# Altium footprint library LED.PcbLib: 71 footprints (part 2 of 5)
Each footprint in its own frame and in the unit in brackets; x right, y up, seen from the top. Pads: shape width x height; smd on the part's side, far side on the other; paste and mask are expansions set on the pad; w line width, h text height; cw(c..) or ccw(c..) is an arc to the next point about the centre after c.
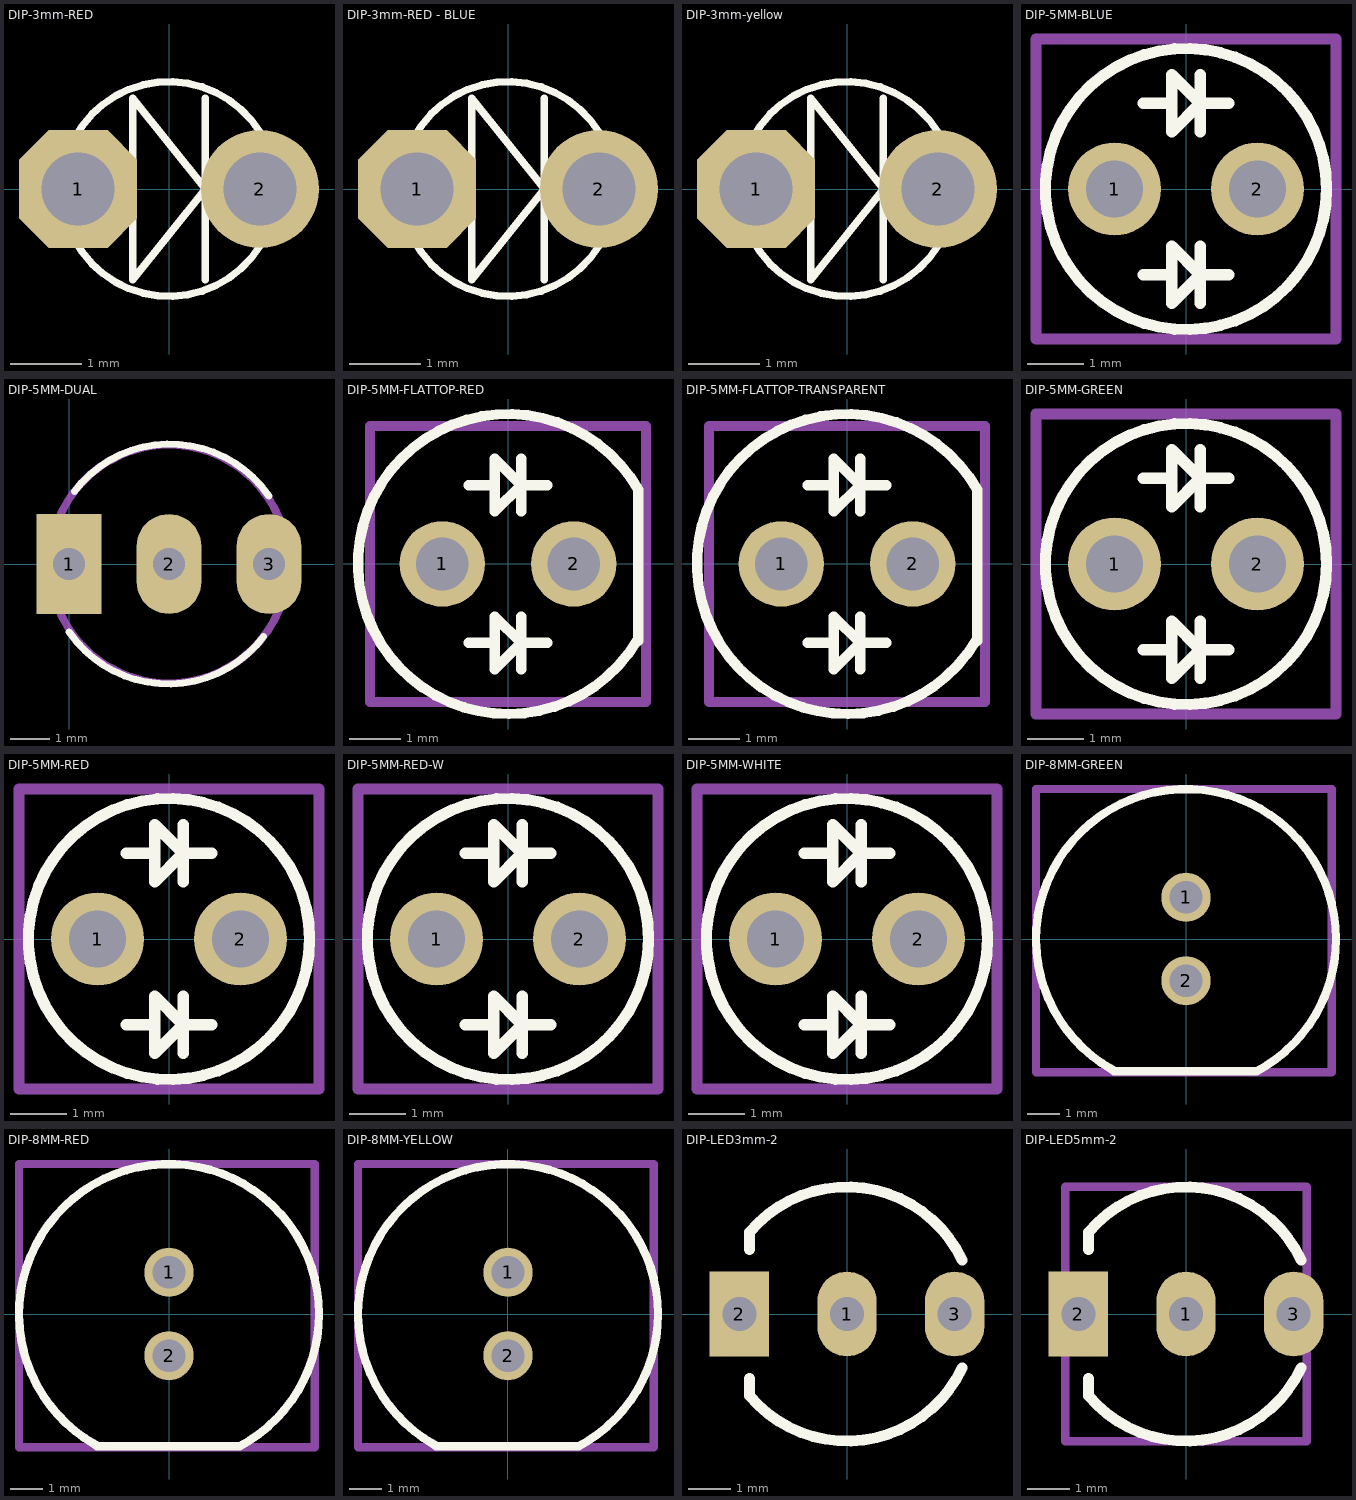
[diagram p1: the footprints below, top view; thin cyan lines are the x and y axes]

## DIP-3mm-RED [mil]
pads (2):
  oct 65x65 hole 40: 1(-50,0)
  round 65 hole 40: 2(50,0)
Top Overlay:
  circle w4: c0,0 r59.06
  lines w4: 20,-50 20,0 ; 20,50 20,0 ; 20,0 -20,-50 -20,50 20,0
3D body "User Library-LED-D3R.step": height 181.1, standoff -255.91, extent -77.18,-77.48 67.18,80

## DIP-3mm-RED - BLUE [mil]
pads (2):
  oct 65x65 hole 40: 1(-50,0)
  round 65 hole 40: 2(50,0)
Top Overlay:
  circle w4: c0,0 r59.06
  lines w4: 20,-50 20,0 ; 20,50 20,0 ; 20,0 -20,-50 -20,50 20,0
3D body "User Library-LED-D3R.step": height 181.1, standoff -255.91, extent -77.18,-77.48 67.18,80

## DIP-3mm-yellow [mil]
pads (2):
  oct 65x65 hole 40: 1(-50,0)
  round 65 hole 40: 2(50,0)
Top Overlay:
  circle w4: c0,0 r59.06
  lines w4: 20,-50 20,0 ; 20,50 20,0 ; 20,0 -20,50 -20,-50 20,0
3D body "User Library-LED-D3R.step": height 181.1, standoff -255.91, extent -77.18,-77.48 67.18,80

## DIP-5MM-BLUE [mil]
pads (2):
  round 65 hole 40: 1(-50,0) 2(50,0)
Top Overlay:
  circle w7.87: c0,0 r98.43
  lines w7.87: -30,-60 -10,-60 ; -30,60 -10,60 ; 10,-80 10,-40 ; 10,40 10,80 ; 30,-60 10,-60 ; 30,60 10,60 ; 10,-60 -10,-40 -10,-80 10,-60 ; 10,60 -10,80 -10,40 10,60
Mechanical 13:
  lines w7.87: -105,-105 -105,105 105,105 105,-105 -105,-105
Mechanical 15:
  lines w7.87: -105,-105 -105,105 105,105 105,-105 -105,-105
3D body: height 60, standoff -120, extent -62.5,-13 -37.5,12
3D body: height 110, standoff 70, extent -105,-105.2 105,104.79
3D body: height 370, standoff 170, extent -99.59,-100.31 99.96,99.47
3D body: height 270, standoff 70, extent -99.79,-100.07 100.21,99.68
3D body: height 170, standoff 160, extent -5,-5 5,5
3D body: height 160, standoff 150, extent -29,-7 -20,7
3D body: height 160, standoff 150, extent -15,-33 40,33
3D body: height 150, standoff 50, extent 19,-12.5 62,12.5
3D body: height 150, standoff 50, extent -63,-13 -20,12
3D body: height 50, standoff -120, extent 37,-12.5 62,12.5

## DIP-5MM-DUAL [mil] "LED 3 PIN, 5 ly , Two colour"
height 300
pads (3):
  rect 65x100 hole 32: 1(0,0)
  oval 65x100 hole 32: 2(100,0) 3(200,0)
Top Overlay:
  lines w7: 0.07,-67.92 ccw(c99,0) 194.73,-72.36 ; 5.27,72.36 cw(c101,0) 199.93,67.92
Mechanical 13:
  circle w7.87: c100,0 r119.25
  text ".Designator" at 0,0 h59.06
Mechanical 15:
  circle w7.87: c100,0 r119.25
  text ".Comment" at 0,0 h59.06
3D body "User Library-5mmBiColorLED.step": height 426.6, standoff -102.4, extent -16,-115.98 210,115.98

## DIP-5MM-FLATTOP-RED [mil]
pads (2):
  round 65 hole 40: 1(-50,0) 2(50,0)
Top Overlay:
  lines w7.87: -30,-60 -10,-60 ; -30,60 -10,60 ; 10,-80 10,-40 ; 10,40 10,80 ; 30,-60 10,-60 ; 30,60 10,60 ; 10,-60 -10,-80 -10,-40 10,-60 ; 10,60 -10,40 -10,80 10,60 ; 97.96,-58.65 cw(c0,0) 99.13,56.64 99.13,-58.65 97.96,-58.65
Mechanical 13:
  lines w7.87: -105,-105 105,-105 105,105 -105,105 -105,-105
  text ".Designator" at -62.2,-30.12 h59.06
3D body: height 50, standoff -120, extent 37,-12.5 62,12.5
3D body: height 150, standoff 50, extent -63,-13 -20,12
3D body: height 150, standoff 50, extent 19,-12.5 62,12.5
3D body: height 160, standoff 150, extent -15,-33 40,33
3D body: height 60, standoff -120, extent -62.5,-13 -37.5,12
3D body: height 160, standoff 150, extent -29,-7 -20,7
3D body: height 170, standoff 160, extent -5,-5 5,5
3D body: height 267.72, standoff 0, extent -99.79,-100.07 100.21,99.68
3D body: height 40, standoff 0, extent -113.96,-114.24 114.39,113.85

## DIP-5MM-FLATTOP-TRANSPARENT [mil]
pads (2):
  round 65 hole 40: 1(-50,0) 2(50,0)
Top Overlay:
  lines w7.87: -30,-60 -10,-60 ; -30,60 -10,60 ; 10,-80 10,-40 ; 10,40 10,80 ; 30,-60 10,-60 ; 30,60 10,60 ; 10,-60 -10,-80 -10,-40 10,-60 ; 10,60 -10,40 -10,80 10,60 ; 97.96,-58.65 cw(c0,0) 99.13,56.64 99.13,-58.65 97.96,-58.65
Mechanical 13:
  lines w7.87: -105,-105 105,-105 105,105 -105,105 -105,-105
  text ".Designator" at -62.2,-30.12 h59.06
3D body: height 50, standoff -120, extent 37,-12.5 62,12.5
3D body: height 150, standoff 50, extent -63,-13 -20,12
3D body: height 150, standoff 50, extent 19,-12.5 62,12.5
3D body: height 160, standoff 150, extent -15,-33 40,33
3D body: height 60, standoff -120, extent -62.5,-13 -37.5,12
3D body: height 160, standoff 150, extent -29,-7 -20,7
3D body: height 170, standoff 160, extent -5,-5 5,5
3D body: height 267.72, standoff 0, extent -99.79,-100.07 100.21,99.68
3D body: height 40, standoff 0, extent -113.96,-114.24 114.39,113.85

## DIP-5MM-GREEN [mil]
pads (2):
  round 65 hole 40: 1(-50,0) 2(50,0)
Top Overlay:
  circle w7.87: c0,0 r98.43
  lines w7.87: -30,-60 -10,-60 ; -30,60 -10,60 ; 10,-80 10,-40 ; 10,40 10,80 ; 30,-60 10,-60 ; 30,60 10,60 ; 10,-60 -10,-80 -10,-40 10,-60 ; 10,60 -10,40 -10,80 10,60
Mechanical 13:
  lines w7.87: -105,-105 105,-105 105,105 -105,105 -105,-105
Mechanical 15:
  lines w7.87: -105,-105 105,-105 105,105 -105,105 -105,-105
3D body: height 50, standoff -120, extent 37,-12.5 62,12.5
3D body: height 150, standoff 50, extent -63,-13 -20,12
3D body: height 150, standoff 50, extent 19,-12.5 62,12.5
3D body: height 160, standoff 150, extent -15,-33 40,33
3D body: height 60, standoff -120, extent -62.5,-13 -37.5,12
3D body: height 160, standoff 150, extent -29,-7 -20,7
3D body: height 170, standoff 160, extent -5,-5 5,5
3D body: height 270, standoff 70, extent -99.79,-100.07 100.21,99.68
3D body: height 370, standoff 170, extent -99.59,-100.31 99.96,99.47
3D body: height 110, standoff 70, extent -105,-105.2 105,104.79

## DIP-5MM-RED [mil]
pads (2):
  round 65 hole 40: 1(-50,0) 2(50,0)
Top Overlay:
  circle w7.87: c0,0 r98.43
  lines w7.87: -30,-60 -10,-60 ; -30,60 -10,60 ; 10,-80 10,-40 ; 10,40 10,80 ; 30,-60 10,-60 ; 30,60 10,60 ; 10,-60 -10,-40 -10,-80 10,-60 ; 10,60 -10,80 -10,40 10,60
Mechanical 13:
  lines w7.87: -105,-105 -105,105 105,105 105,-105 -105,-105
Mechanical 15:
  lines w7.87: -105,-105 -105,105 105,105 105,-105 -105,-105
3D body: height 110, standoff 70, extent -104.17,-105 105,104.59
3D body: height 370, standoff 170, extent -99,-100 99.96,99.15
3D body: height 270, standoff 70, extent -99,-100 100.21,99.61
3D body: height 170, standoff 160, extent -5,-5 5,5
3D body: height 160, standoff 150, extent -29,-7 -20,7
3D body: height 60, standoff -120, extent -62.5,-13 -37.5,12
3D body: height 160, standoff 150, extent -15,-33 40,33
3D body: height 150, standoff 50, extent 19,-12.5 62,12.5
3D body: height 150, standoff 50, extent -63,-13 -20,12
3D body: height 50, standoff -120, extent 37,-12.5 62,12.5

## DIP-5MM-RED-W [mil]
pads (2):
  round 65 hole 40: 1(-50,0) 2(50,0)
Top Overlay:
  circle w7.87: c0,0 r98.43
  lines w7.87: -30,-60 -10,-60 ; -30,60 -10,60 ; 10,-80 10,-40 ; 10,40 10,80 ; 30,-60 10,-60 ; 30,60 10,60 ; 10,-60 -10,-40 -10,-80 10,-60 ; 10,60 -10,80 -10,40 10,60
Mechanical 13:
  lines w7.87: -105,-105 -105,105 105,105 105,-105 -105,-105
Mechanical 15:
  lines w7.87: -105,-105 -105,105 105,105 105,-105 -105,-105
3D body "ALSRobot-LED Red 5mm V.STEP": height 314.95, standoff -39.37, extent -119.09,-411.85 103.35,10.27

## DIP-5MM-WHITE [mil]
pads (2):
  round 65 hole 40: 1(-50,0) 2(50,0)
Top Overlay:
  circle w7.87: c0,0 r98.43
  lines w7.87: -30,-60 -10,-60 ; -30,60 -10,60 ; 10,-80 10,-40 ; 10,40 10,80 ; 30,-60 10,-60 ; 30,60 10,60 ; 10,-60 -10,-80 -10,-40 10,-60 ; 10,60 -10,40 -10,80 10,60
Mechanical 13:
  lines w7.87: -105,-105 105,-105 105,105 -105,105 -105,-105
Mechanical 15:
  lines w7.87: -105,-105 105,-105 105,105 -105,105 -105,-105
3D body: height 50, standoff -120, extent 37,-12.5 62,12.5
3D body: height 150, standoff 50, extent -63,-13 -20,12
3D body: height 150, standoff 50, extent 19,-12.5 62,12.5
3D body: height 160, standoff 150, extent -15,-33 40,33
3D body: height 60, standoff -120, extent -62.5,-13 -37.5,12
3D body: height 160, standoff 150, extent -29,-7 -20,7
3D body: height 170, standoff 160, extent -5,-5 5,5
3D body: height 270, standoff 70, extent -99.79,-100.07 100.21,99.68
3D body: height 370, standoff 170, extent -99.59,-100.31 99.96,99.47
3D body: height 110, standoff 70, extent -105,-105.2 105,104.79

## DIP-8MM-GREEN [mm]
pads (2):
  round 1.5 hole 1: 1(0,1.27) 2(0,-1.27)
Top Overlay:
  lines w0.254: -2.241,-3.985 cw(c0,0) 4.572,0 cw(c0,0) 2.152,-4.034 -2.192,-4.034 -2.241,-3.985
Mechanical 13:
  lines w0.254: -4.572,-4.064 -4.572,4.572 4.445,4.572 4.445,-4.064 -4.572,-4.064
  text ".Designator" at -2.54,0 h0.64
Mechanical 15:
  lines w0.254: -4.572,-4.064 -4.572,4.572 4.445,4.572 4.445,-4.064 -4.572,-4.064
  text ".Comment" at -2.54,0 h0.64
3D body "User Library-BL-L813_G.step": height 11, standoff -31, extent -4.5,-4.03 4.5,4.5

## DIP-8MM-RED [mm]
pads (2):
  round 1.5 hole 1: 1(0,1.27) 2(0,-1.27)
Top Overlay:
  lines w0.254: -2.241,-3.985 cw(c0,0) 4.572,0 cw(c0,0) 2.152,-4.034 -2.192,-4.034 -2.241,-3.985
Mechanical 13:
  lines w0.254: -4.572,-4.064 4.445,-4.064 4.445,4.572 -4.572,4.572 -4.572,-4.064
  text ".Designator" at -2.54,0 h0.64
Mechanical 15:
  lines w0.254: -4.572,-4.064 4.445,-4.064 4.445,4.572 -4.572,4.572 -4.572,-4.064
  text ".Comment" at -2.54,0 h0.64
3D body "User Library-BL-L813_R.step": height 11.3, standoff -30.7, extent -4.5,-4.03 4.5,4.5

## DIP-8MM-YELLOW [mm]
pads (2):
  round 1.5 hole 1: 1(0,1.27) 2(0,-1.27)
Top Overlay:
  lines w0.254: -2.241,-3.985 cw(c0,0) 4.572,0 cw(c0,0) 2.152,-4.034 -2.192,-4.034 -2.241,-3.985
Mechanical 13:
  lines w0.254: -4.572,-4.064 4.445,-4.064 4.445,4.572 -4.572,4.572 -4.572,-4.064
  text ".Designator" at -2.54,0 h0.64
Mechanical 15:
  lines w0.254: -4.572,-4.064 4.445,-4.064 4.445,4.572 -4.572,4.572 -4.572,-4.064
  text ".Comment" at -2.54,0 h0.64
3D body "User Library-BL-L813_Y.step": height 11, standoff -31, extent -4.5,-4.03 4.5,4.5

## DIP-LED3mm-2 [mm]
pads (3):
  oval 1.4x2 hole 0.8: 1(0,0) 3(2.54,0)
  rect 1.4x2 hole 0.8: 2(-2.54,0)
Top Overlay:
  lines w0.254: -2.298,-1.524 -2.298,-1.928 ccw(c0,0) 2.719,-1.268 ; -2.298,1.524 -2.298,1.928 cw(c0,0) 2.719,1.268
3D body "User Library-LED RG.step": height 7.91, standoff -5.52, extent -2.25,-2 2.25,2

## DIP-LED5mm-2 [mm]
pads (3):
  oval 1.4x2 hole 0.8: 1(0,0) 3(2.54,0)
  rect 1.4x2 hole 0.8: 2(-2.54,0)
Top Overlay:
  lines w0.254: -2.298,-1.524 -2.298,-1.928 ccw(c0,0) 2.719,-1.268 ; -2.298,1.524 -2.298,1.928 cw(c0,0) 2.719,1.268
Mechanical 13:
  lines w0.2: -2.85,-3 -2.85,3 2.85,3 2.85,-3 -2.85,-3
  text ".Designator" at -2.54,0 h1.5
Mechanical 15:
  lines w0.2: -2.85,-3 2.85,-3 2.85,3 -2.85,3 -2.85,-3
  text ".Comment" at -2.54,0 h1.5
3D body "User Library-5BC-3-CA-F.STEP": height 11.6, standoff -3.01, extent -2.843,-2.925 2.843,2.875